# Altium footprint library idc.PcbLib: 45 footprints (part 1 of 3)
Each footprint in its own frame and in the unit in brackets; x right, y up, seen from the top. Pads: shape width x height; smd on the part's side, far side on the other; paste and mask are expansions set on the pad; w line width, h text height; cw(c..) or ccw(c..) is an arc to the next point about the centre after c.
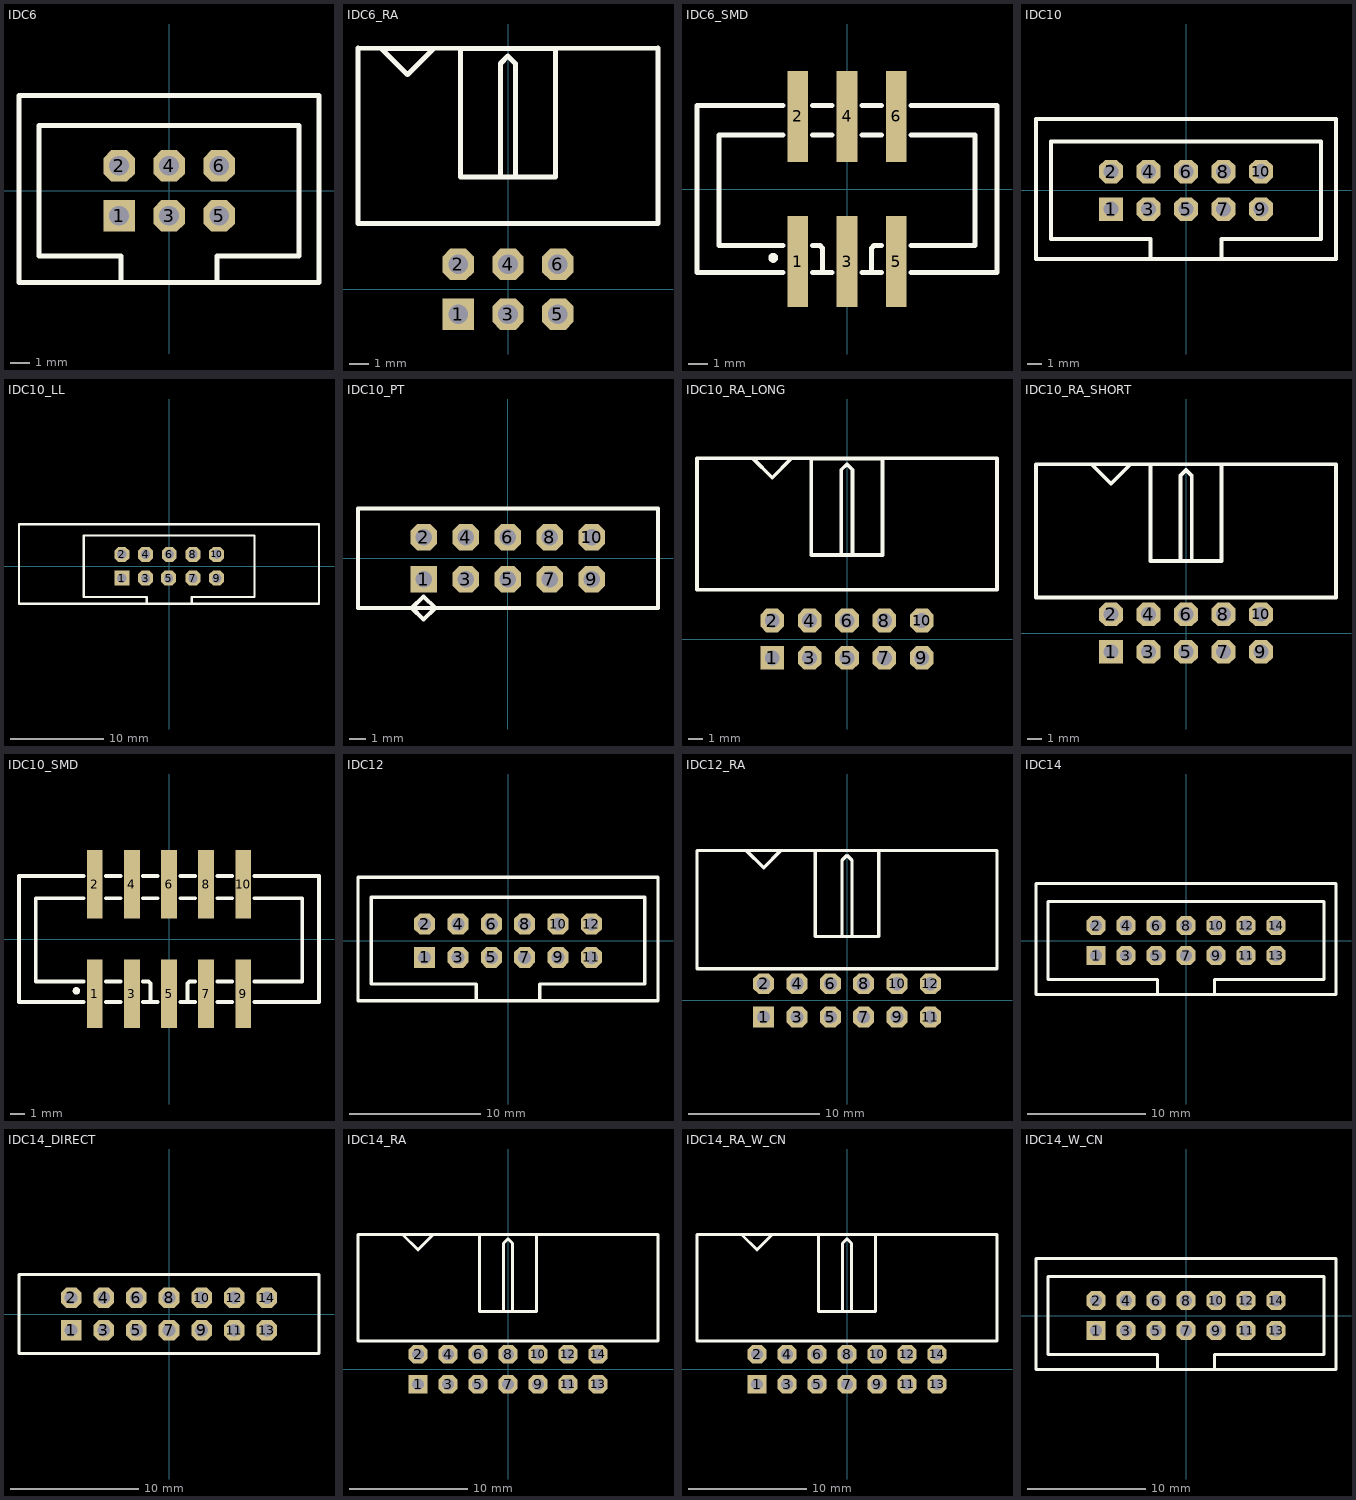
[diagram p0: the footprints below, top view; thin cyan lines are the x and y axes]

## IDC6 [mm] "2.54mm, 6 Pin IDC Male Connector"
pads (6):
  rect 1.6x1.6 hole 1: 1(-2.54,-1.27)
  oct 1.6x1.6 hole 1: 2(-2.54,1.27) 3(0,-1.27) 4(0,1.27) 5(2.54,-1.27) 6(2.54,1.27)
Top Overlay:
  lines w0.254: -2.438,-4.645 -2.438,-3.32 ; -2.438,-3.302 -6.604,-3.302 -6.604,3.302 6.604,3.302 6.604,-3.302 2.438,-3.302 ; 2.438,-4.645 2.438,-3.32 ; -7.62,-4.64 -7.615,-4.645 7.61,-4.645 7.61,4.826 -7.62,4.826 -7.62,-4.64
3D body "HTST-103-01-LM-D.STEP": height 9.29, standoff -2.9, extent -7.62,-4.57 7.62,4.701

## IDC6_RA [mm] "2.54mm, 6 Pin IDC Male Connector"
pads (6):
  rect 1.6x1.6 hole 1: 1(-2.54,-1.27)
  oct 1.6x1.6 hole 1: 2(-2.54,1.27) 3(0,-1.27) 4(0,1.27) 5(2.54,-1.27) 6(2.54,1.27)
Top Overlay:
  lines w0.254: -2.415,12.257 -7.64,12.28 -7.64,3.355 7.64,3.355 7.64,12.28 2.36,12.261 2.408,12.261 ; -0.386,5.708 -0.386,11.499 -0.005,11.88 0.376,11.499 0.376,5.708 ; 2.408,5.708 -2.418,5.708 -2.418,12.261 2.408,12.261 ; 2.408,5.759 2.408,12.261 ; -6.423,12.238 -5.115,10.93 -3.794,12.251 -6.423,12.238
3D body "TST-103-04-G-D-RA.STEP": height 9.45, standoff -3.13, extent -7.62,-1.587 7.62,12.278

## IDC6_SMD [mm] "2.54mm, 6 Pin IDC Male Connector, SMD"
height 9.7
pads (6):
  rect 1.07x4.7 smd: 1(-2.54,-3.746) 2(-2.54,3.746) 3(0,-3.746) 4(0,3.746) 5(2.54,-3.746) 6(2.54,3.746)
Top Overlay:
  circle w0.254: c-3.81,-3.556 r0.127
  lines w0.254: -3.302,-4.318 -7.747,-4.318 -7.747,4.318 -3.302,4.318 ; -3.302,-2.921 -6.604,-2.921 -6.604,2.794 -3.302,2.794 ; -1.778,-4.318 -0.762,-4.318 ; -1.778,-2.921 -1.397,-2.921 -1.27,-3.048 -1.27,-4.246 ; -1.778,2.794 -0.762,2.794 ; -1.778,4.318 -0.762,4.318 ; 0.762,-4.318 1.778,-4.318 ; 0.762,2.794 1.778,2.794 ; 0.762,4.318 1.778,4.318 ; 1.27,-4.246 1.27,-3.048 1.397,-2.921 1.778,-2.921 ; 3.302,-4.318 7.747,-4.318 7.747,4.318 3.302,4.318 ; 3.302,-2.921 6.604,-2.921 6.604,2.794 3.302,2.794
3D body "HTST-103-01-T-DV.stp": height 10.14, standoff -0.02, extent -7.62,-5.588 7.62,5.588

## IDC10 [mm] "2.54mm, 10 Pin IDC Male Connector"
height 9.45
pads (10):
  rect 1.6x1.6 hole 1: 1(-5.08,-1.27)
  oct 1.6x1.6 hole 1: 2(-5.08,1.27) 3(-2.54,-1.27) 4(-2.54,1.27) 5(0,-1.27) 6(0,1.27) 7(2.54,-1.27) 8(2.54,1.27) 9(5.08,-1.27) 10(5.08,1.27)
Top Overlay:
  lines w0.254: -2.413,-4.5 -2.413,-3.302 -9.144,-3.302 -9.144,3.302 9.144,3.302 9.144,-3.302 2.413,-3.302 2.413,-4.5 ; -10.16,-4.645 10.16,-4.645 10.16,4.826 -10.16,4.826 -10.16,-4.645
3D body "Samtec-HTST-105-01-G-D.STEP": height 9.27, standoff -2.92, extent -10.16,-4.648 10.16,4.826

## IDC10_LL [mm] "2.54mm, 10 Pin IDC Male Connector, Long Locking Levers"
height 25.7
pads (10):
  rect 1.6x1.6 hole 1: 1(-5.08,-1.27)
  oct 1.6x1.6 hole 1: 2(-5.08,1.27) 3(-2.54,-1.27) 4(-2.54,1.27) 5(-0.076,-1.27) 6(0,1.27) 7(2.54,-1.27) 8(2.54,1.27) 9(5.08,-1.27) 10(5.08,1.27)
Top Overlay:
  lines w0.254: -2.413,-4.039 -2.413,-3.302 -9.144,-3.302 -9.144,3.302 9.144,3.302 9.144,-3.302 2.413,-3.302 2.413,-4.039 ; -16.104,-4.039 16.053,-4.039 16.053,4.521 -16.104,4.521 -16.104,-4.039
3D body "header_awh10g-0232-t.stp": height 27.6, standoff -3.3, extent -15.975,-3.906 15.925,4.394

## IDC10_PT [mm] "2.54mm, 10 Pin IDC Plug Dip Type"
height 7.35
pads (10):
  rect 1.6x1.6 hole 1: 1(-5.08,-1.27)
  oct 1.6x1.6 hole 1: 2(-5.08,1.27) 3(-2.54,-1.27) 4(-2.54,1.27) 5(0,-1.27) 6(0,1.27) 7(2.54,-1.27) 8(2.54,1.27) 9(5.08,-1.27) 10(5.08,1.27)
Top Overlay:
  lines w0.254: -5.893,-3.023 -5.791,-3.023 -5.08,-2.311 -4.369,-3.023 ; -5.791,-2.997 -5.08,-3.708 -4.369,-2.997 ; -9.042,-3.023 9.093,-3.023 9.093,2.997 -9.042,2.997 -9.042,-3.023
3D body "connector_awlp10_3_2t.stp": height 15, standoff -3.3, extent -9.05,-3 9.05,3

## IDC10_RA_LONG [mm] "2.54mm, 10 Pin IDC Male Connector, Right Angle"
height 9.45
pads (10):
  rect 1.6x1.6 hole 1: 1(-5.08,-1.27)
  oct 1.6x1.6 hole 1: 2(-5.08,1.27) 3(-2.54,-1.27) 4(-2.54,1.27) 5(0,-1.27) 6(0,1.27) 7(2.54,-1.27) 8(2.54,1.27) 9(5.08,-1.27) 10(5.08,1.27)
Top Overlay:
  lines w0.254: -0.386,5.708 -0.386,11.499 -0.005,11.88 0.376,11.499 0.376,5.708 ; 2.408,5.708 -2.418,5.708 -2.418,12.261 ; 2.408,5.759 2.408,12.261 ; -6.388,12.263 -10.18,12.28 -10.18,3.355 10.18,3.355 10.18,12.28 2.408,12.261 ; -6.388,12.263 -5.08,10.955 -3.759,12.276 ; -6.388,12.263 -3.759,12.276 ; -3.759,12.276 -2.418,12.261 ; -2.418,12.261 2.408,12.261
3D body "TST-105-04-G-D-RA.STEP": height 9.45, standoff -3.13, extent -10.16,-1.587 10.16,12.278

## IDC10_RA_SHORT [mm] "2.54mm, 10 Pin IDC Male Connector, Right Angle"
height 9.45
pads (10):
  rect 1.6x1.6 hole 1: 1(-5.08,-1.27)
  oct 1.6x1.6 hole 1: 2(-5.08,1.27) 3(-2.54,-1.27) 4(-2.54,1.27) 5(0,-1.27) 6(0,1.27) 7(2.54,-1.27) 8(2.54,1.27) 9(5.08,-1.27) 10(5.08,1.27)
Top Overlay:
  lines w0.254: -6.388,11.417 -5.08,10.109 -3.759,11.43 ; -2.413,11.43 -2.413,4.877 2.413,4.877 ; -0.381,4.877 -0.381,10.668 0,11.049 0.381,10.668 0.381,4.877 ; 2.413,4.928 2.413,11.43 ; -10.16,2.413 -10.16,11.43 10.16,11.43 10.16,2.413 -10.16,2.413
3D body "Samtec-HTST-105-01-G-D-RA.step": height 9.46, standoff -3.24, extent -10.14,-1.57 10.18,11.384

## IDC10_SMD [mm] "2.54mm, 10 Pin IDC Male Connector, SMD"
height 9.7
pads (10):
  rect 1.07x4.7 smd: 1(-5.08,-3.746) 2(-5.08,3.746) 3(-2.54,-3.746) 4(-2.54,3.746) 5(0,-3.746) 6(0,3.746) 7(2.54,-3.746) 8(2.54,3.746) 9(5.08,-3.746) 10(5.08,3.746)
Top Overlay:
  circle w0.254: c-6.35,-3.556 r0.127
  lines w0.254: -5.842,-4.318 -10.287,-4.318 -10.287,4.318 -5.842,4.318 ; -5.842,-2.921 -9.144,-2.921 -9.144,2.794 -5.842,2.794 ; -4.318,-4.318 -3.302,-4.318 ; -4.318,-2.921 -3.302,-2.921 ; -4.318,2.794 -3.302,2.794 ; -4.318,4.318 -3.302,4.318 ; -1.778,-4.318 -0.762,-4.318 ; -1.778,-2.921 -1.397,-2.921 -1.27,-3.048 -1.27,-4.246 ; -1.778,2.794 -0.762,2.794 ; -1.778,4.318 -0.762,4.318 ; 0.762,-4.318 1.778,-4.318 ; 0.762,2.794 1.778,2.794 ; 0.762,4.318 1.778,4.318 ; 1.27,-4.246 1.27,-3.048 1.397,-2.921 1.778,-2.921 ; 3.302,-4.318 4.318,-4.318 ; 3.302,-2.921 4.318,-2.921 ; 3.302,2.794 4.318,2.794 ; 3.302,4.318 4.318,4.318 ; 5.842,-4.318 10.287,-4.318 10.287,4.318 5.842,4.318 ; 5.842,-2.921 9.144,-2.921 9.144,2.794 5.842,2.794
3D body "HTST-105-01-T-DV.stp": height 10.14, standoff -0.02, extent -10.16,-5.651 10.16,5.525

## IDC12 [mm] "2.54mm, 12 Pin IDC Male Connector"
height 9.45
pads (12):
  rect 1.6x1.6 hole 1: 1(-6.35,-1.27)
  oct 1.6x1.6 hole 1: 2(-6.35,1.27) 3(-3.81,-1.27) 4(-3.81,1.27) 5(-1.27,-1.27) 6(-1.27,1.27) 7(1.27,-1.27) 8(1.27,1.27) 9(3.81,-1.27) 10(3.81,1.27) 11(6.35,-1.27) 12(6.35,1.27)
Top Overlay:
  lines w0.254: -11.43,-4.572 11.43,-4.572 ; -11.43,-4.5 -11.43,4.826 11.43,4.826 11.43,-4.5 ; -2.413,-4.5 -2.413,-3.302 -10.414,-3.302 -10.414,3.302 9.652,3.302 10.414,3.302 10.414,-3.302 2.413,-3.302 2.413,-4.5
3D body "HTST-106-01-G-D.stp": height 9.09, standoff -3.1, extent -11.43,-4.445 11.43,4.826

## IDC12_RA [mm] "2.54mm, 12 Pin IDC Male Connector, Right Angle"
height 9.45
pads (12):
  rect 1.6x1.6 hole 1: 1(-6.35,-1.27)
  oct 1.6x1.6 hole 1: 2(-6.35,1.27) 3(-3.81,-1.27) 4(-3.81,1.27) 5(-1.27,-1.27) 6(-1.27,1.27) 7(1.27,-1.27) 8(1.27,1.27) 9(3.81,-1.27) 10(3.81,1.27) 11(6.35,-1.27) 12(6.35,1.27)
Top Overlay:
  lines w0.254: -7.658,11.417 -6.35,10.109 -5.029,11.43 ; -2.413,11.43 -2.413,4.877 2.413,4.877 ; -0.381,4.877 -0.381,10.668 0,11.049 0.381,10.668 0.381,4.877 ; 2.413,4.928 2.413,11.43 ; -11.43,2.413 -11.43,11.43 11.43,11.43 11.43,2.413 -11.43,2.413
3D body "HTST-106-04-G-D-RA.stp": height 9.35, standoff -3.23, extent -11.43,-1.587 11.43,11.049

## IDC14 [mm] "2.54mm, 14 Pin IDC Male Connector"
height 9.45
pads (14):
  rect 1.6x1.6 hole 1: 1(-7.62,-1.27)
  oct 1.6x1.6 hole 1: 2(-7.62,1.27) 3(-5.08,-1.27) 4(-5.08,1.27) 5(-2.54,-1.27) 6(-2.54,1.27) 7(0,-1.27) 8(0,1.27) 9(2.54,-1.27) 10(2.54,1.27) 11(5.08,-1.27) 12(5.08,1.27) 13(7.62,-1.27) 14(7.62,1.27)
Top Overlay:
  lines w0.254: -12.7,-4.572 12.7,-4.572 ; -12.7,-4.5 -12.7,4.826 12.7,4.826 12.7,-4.5 ; -2.413,-4.5 -2.413,-3.302 -11.684,-3.302 -11.684,3.302 11.684,3.302 11.684,-3.302 2.413,-3.302 2.413,-4.5
3D body "Samtec-HTST-107-01-G-D.STEP": height 2.52, standoff -9.67, extent -12.7,-4.648 12.7,4.826

## IDC14_DIRECT [mm] "2.54mm, 14 Pin IDC Low Profile PCB Wire Bonding"
height 9.45
pads (14):
  rect 1.6x1.6 hole 1: 1(-7.62,-1.27)
  oct 1.6x1.6 hole 1: 2(-7.62,1.27) 3(-5.08,-1.27) 4(-5.08,1.27) 5(-2.54,-1.27) 6(-2.54,1.27) 7(0,-1.27) 8(0,1.27) 9(2.54,-1.27) 10(2.54,1.27) 11(5.08,-1.27) 12(5.08,1.27) 13(7.62,-1.27) 14(7.62,1.27)
Top Overlay:
  lines w0.254: -11.675,-3.075 -11.675,3.075 11.675,3.075 11.675,-3.075 -11.675,-3.075
3D body "61201422323.stp": height 7.32, standoff -3.28, extent -11.615,-3 11.615,3

## IDC14_RA [mm] "2.54mm, 14 Pin IDC Male Connector, Right Angle"
height 9.45
pads (14):
  rect 1.6x1.6 hole 1: 1(-7.62,-1.27)
  oct 1.6x1.6 hole 1: 2(-7.62,1.27) 3(-5.08,-1.27) 4(-5.08,1.27) 5(-2.54,-1.27) 6(-2.54,1.27) 7(0,-1.27) 8(0,1.27) 9(2.54,-1.27) 10(2.54,1.27) 11(5.08,-1.27) 12(5.08,1.27) 13(7.62,-1.27) 14(7.62,1.27)
Top Overlay:
  lines w0.254: -8.928,11.417 -7.62,10.109 -6.299,11.43 ; -2.413,11.43 -2.413,4.877 2.413,4.877 ; -0.381,4.877 -0.381,10.668 0,11.049 0.381,10.668 0.381,4.877 ; 2.413,4.928 2.413,11.43 ; -12.7,2.413 -12.7,11.43 12.7,11.43 12.7,2.413 -12.7,2.413
3D body "Samtec-HTST-107-01-G-D-RA.step": height 9.46, standoff -3.24, extent -12.7,-1.549 12.7,11.405

## IDC14_RA_W_CN [mm] "2.54mm, 14 Pin IDC Male Connector, Right Angle"
height 9.45
pads (14):
  rect 1.6x1.6 hole 1: 1(-7.62,-1.27)
  oct 1.6x1.6 hole 1: 2(-7.62,1.27) 3(-5.08,-1.27) 4(-5.08,1.27) 5(-2.54,-1.27) 6(-2.54,1.27) 7(0,-1.27) 8(0,1.27) 9(2.54,-1.27) 10(2.54,1.27) 11(5.08,-1.27) 12(5.08,1.27) 13(7.62,-1.27) 14(7.62,1.27)
Top Overlay:
  lines w0.254: -8.928,11.417 -7.62,10.109 -6.299,11.43 ; -2.413,11.43 -2.413,4.877 2.413,4.877 ; -0.381,4.877 -0.381,10.668 0,11.049 0.381,10.668 0.381,4.877 ; 2.413,4.928 2.413,11.43 ; -12.7,2.413 12.7,2.413 12.7,11.43 -12.7,11.43 -12.7,2.413
3D body "Samtec-HTST-107-01-G-D-RA.step": height 9.46, standoff -3.24, extent -12.7,-1.549 12.7,11.405
3D body "STEP-61201423021-rev1.stp": height 8.86, standoff 2, extent -11.23,5.1 11.23,20.8

## IDC14_W_CN [mm] "2.54mm, 14 Pin IDC Male Connector"
height 9.45
pads (14):
  rect 1.6x1.6 hole 1: 1(-7.62,-1.27)
  oct 1.6x1.6 hole 1: 2(-7.62,1.27) 3(-5.08,-1.27) 4(-5.08,1.27) 5(-2.54,-1.27) 6(-2.54,1.27) 7(0,-1.27) 8(0,1.27) 9(2.54,-1.27) 10(2.54,1.27) 11(5.08,-1.27) 12(5.08,1.27) 13(7.62,-1.27) 14(7.62,1.27)
Top Overlay:
  lines w0.254: -12.7,-4.572 12.7,-4.572 ; -12.7,-4.5 -12.7,4.826 12.7,4.826 12.7,-4.5 ; -2.413,-4.5 -2.413,-3.302 -11.684,-3.302 -11.684,3.302 11.684,3.302 11.684,-3.302 2.413,-3.302 2.413,-4.5
3D body "Samtec-HTST-107-01-G-D.STEP": height 2.52, standoff -9.67, extent -12.7,-4.648 12.7,4.826
3D body "STEP-61201423021-rev1.stp": height 18.7, standoff 3, extent -11.23,-3.86 11.23,3